# Altium footprint library Relays.PcbLib: 115 footprints (part 8 of 8)
Each footprint in its own frame and in the unit in brackets; x right, y up, seen from the top. Pads: shape width x height; smd on the part's side, far side on the other; paste and mask are expansions set on the pad; w line width, h text height; cw(c..) or ccw(c..) is an arc to the next point about the centre after c.
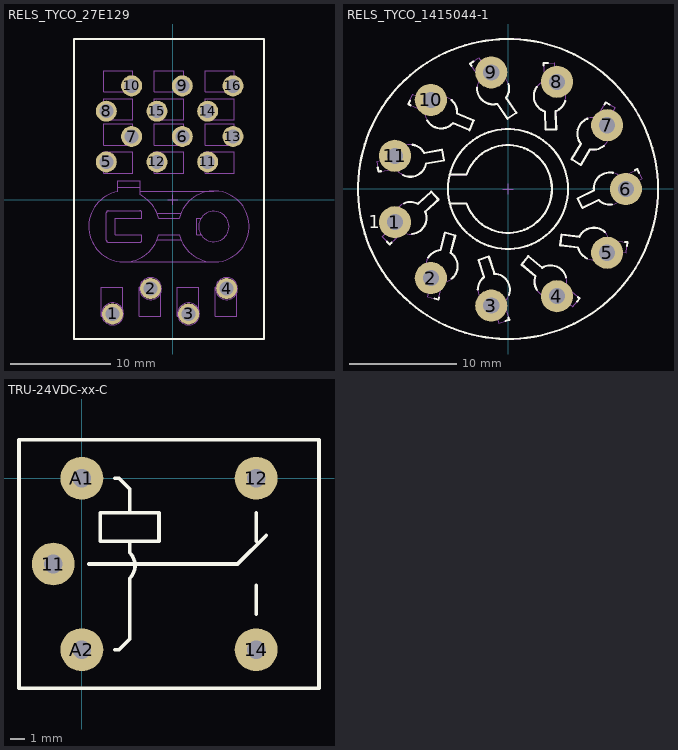
[diagram p7: the footprints below, top view; thin cyan lines are the x and y axes]

## RELS_TYCO_27E129 [mm] "16 Contacts PCB Socket For TYCO R10 Series Relays"
height 10.64
pads (16):
  round 2.1 hole 1.4: 1(-6.033,-11.43) 2(-2.222,-8.89) 3(1.587,-11.43) 4(5.398,-8.89) 5(-6.668,3.81) 6(0.953,6.35) 7(-4.128,6.35) 8(-6.668,8.89) 9(0.953,11.43) 10(-4.128,11.43) 11(3.493,3.81) 12(-1.587,3.81) 13(6.033,6.35) 14(3.493,8.89) 15(-1.587,8.89) 16(6.033,11.43)
Top Overlay:
  lines w0.2: -9.906,-13.945 -9.906,16.129 9.144,16.129 9.144,-13.945 -9.906,-13.945
Mechanical 8:
  circle w0.1: c5.398,-8.89 r1.1
  circle w0.1: c1.587,-11.43 r1.1
  circle w0.1: c-2.222,-8.89 r1.1
  circle w0.1: c-6.033,-11.43 r1.1
  lines w0.1: -7.168,3.81 -6.668,3.81 ; -7.168,8.89 -6.668,8.89 ; -6.668,3.31 -6.668,3.81 ; -6.668,4.31 -6.668,3.81 ; -6.668,8.39 -6.668,8.89 ; -6.668,9.39 -6.668,8.89 ; -6.533,-11.43 -6.033,-11.43 ; -6.168,3.81 -6.668,3.81 ; -6.168,8.89 -6.668,8.89 ; -6.033,-11.93 -6.033,-11.43 ; -6.033,-10.93 -6.033,-11.43 ; -5.533,-11.43 -6.033,-11.43 ; -4.628,6.35 -4.128,6.35 ; -4.628,11.43 -4.128,11.43 ; -4.128,5.85 -4.128,6.35 ; -4.128,6.85 -4.128,6.35 ; -4.128,10.93 -4.128,11.43 ; -4.128,11.93 -4.128,11.43 ; -3.628,6.35 -4.128,6.35 ; -3.628,11.43 -4.128,11.43 ; -2.723,-8.89 -2.222,-8.89 ; -2.222,-9.39 -2.222,-8.89 ; -2.222,-8.39 -2.222,-8.89 ; -2.088,3.81 -1.587,3.81 ; -2.088,8.89 -1.587,8.89 ; -1.723,-8.89 -2.222,-8.89 ; -1.587,3.31 -1.587,3.81 ; -1.587,4.31 -1.587,3.81 ; -1.587,8.39 -1.587,8.89 ; -1.587,9.39 -1.587,8.89 ; -1.088,3.81 -1.587,3.81 ; -1.088,8.89 -1.587,8.89 ; -0.5,0 0,0 ; 0,-0.5 0,0 ; 0,0.5 0,0 ; 0.453,6.35 0.953,6.35 ; 0.453,11.43 0.953,11.43 ; 0.5,0 0,0 ; 0.953,5.85 0.953,6.35 ; 0.953,6.85 0.953,6.35 ; 0.953,10.93 0.953,11.43 ; 0.953,11.93 0.953,11.43 ; 1.088,-11.43 1.587,-11.43 ; 1.453,6.35 0.953,6.35 ; 1.453,11.43 0.953,11.43 ; 1.587,-11.93 1.587,-11.43 ; 1.587,-10.93 1.587,-11.43 ; 2.088,-11.43 1.587,-11.43 ; 2.993,3.81 3.493,3.81 ; 2.993,8.89 3.493,8.89 ; 3.493,3.31 3.493,3.81 ; 3.493,4.31 3.493,3.81 ; 3.493,8.39 3.493,8.89 ; 3.493,9.39 3.493,8.89 ; 3.993,3.81 3.493,3.81 ; 3.993,8.89 3.493,8.89 ; 4.898,-8.89 5.398,-8.89 ; 5.398,-9.39 5.398,-8.89 ; 5.398,-8.39 5.398,-8.89 ; 5.533,6.35 6.033,6.35 ; 5.533,11.43 6.033,11.43 ; 5.898,-8.89 5.398,-8.89 ; 6.033,5.85 6.033,6.35 ; 6.033,6.85 6.033,6.35 ; 6.033,10.93 6.033,11.43 ; 6.033,11.93 6.033,11.43 ; 6.533,6.35 6.033,6.35 ; 6.533,11.43 6.033,11.43
Mechanical 14:
  circle w0.1: c4.115,-2.667 r1.524
  lines w0.1: -5.512,1.27 -3.277,1.27 ; -4.877,-6.223 4.115,-6.223 ; -3.277,0.889 4.115,0.889 ; -1.58,-4.001 0.818,-4.001 ; -1.58,-1.333 0.818,-1.333 ; 2.834,-3.493 2.4,-3.493 2.4,-1.841 2.834,-1.841 ; -9.906,-13.945 -9.906,16.129 9.144,16.129 9.144,-13.945 -9.906,-13.945 ; -7.163,-11.659 -7.163,-8.738 -5.029,-8.738 -5.029,-11.659 -7.163,-11.659 ; -6.922,2.692 -4.001,2.692 -4.001,4.826 -6.922,4.826 -6.922,2.692 ; -6.922,5.486 -4.001,5.486 -4.001,7.62 -6.922,7.62 -6.922,5.486 ; -6.922,8.026 -4.001,8.026 -4.001,10.16 -6.922,10.16 -6.922,8.026 ; -6.922,10.82 -4.001,10.82 -4.001,12.954 -6.922,12.954 -6.922,10.82 ; -6.655,-4.044 ccw(c-6.457,-4.044) -6.457,-4.242 -3.297,-4.242 ccw(c-3.297,-4.044) -3.099,-4.044 -3.099,-3.493 -5.791,-3.493 -5.791,-1.841 -3.099,-1.841 -3.099,-1.29 ccw(c-3.297,-1.29) -3.297,-1.092 -6.457,-1.092 ccw(c-6.457,-1.29) -6.655,-1.29 -6.655,-4.044 ; -5.512,0.832 ccw(c-4.877,-2.667) -1.418,-3.493 0.656,-3.493 ccw(c4.115,-2.667) 0.656,-1.842 -1.418,-1.841 ccw(c-4.877,-2.667) -3.277,0.509 -3.277,1.905 -5.512,1.905 -5.512,0.832 ; -3.353,-11.659 -3.353,-8.738 -1.219,-8.738 -1.219,-11.659 -3.353,-11.659 ; -1.841,2.692 1.079,2.692 1.079,4.826 -1.841,4.826 -1.841,2.692 ; -1.841,5.486 1.079,5.486 1.079,7.62 -1.841,7.62 -1.841,5.486 ; -1.841,8.026 1.079,8.026 1.079,10.16 -1.841,10.16 -1.841,8.026 ; -1.841,10.82 1.079,10.82 1.079,12.954 -1.841,12.954 -1.841,10.82 ; 0.457,-11.659 0.457,-8.738 2.591,-8.738 2.591,-11.659 0.457,-11.659 ; 3.239,2.692 3.239,4.826 6.16,4.826 6.16,2.692 3.239,2.692 ; 3.239,5.486 6.16,5.486 6.16,7.62 3.239,7.62 3.239,5.486 ; 3.239,8.026 6.16,8.026 6.16,10.16 3.239,10.16 3.239,8.026 ; 3.239,10.82 6.16,10.82 6.16,12.954 3.239,12.954 3.239,10.82 ; 4.267,-11.659 4.267,-8.738 6.401,-8.738 6.401,-11.659 4.267,-11.659
  text "13" at 3.608,5.85 h1
  text "10" at -6.531,10.93 h1
  text "9" at -1.218,10.93 h1
  text "16" at 3.604,10.93 h1
  text "14" at 4.519,8.39 h1
  text "15" at -0.532,8.39 h1
  text "8" at -5.341,8.39 h1
  text "7" at -6.281,5.85 h1
  text "6" at -1.196,5.85 h1
  text "11" at 4.669,3.31 h1
  text "12" at -0.541,3.31 h1
  text "5" at -5.362,3.31 h1
  text "4" at 4.934,-11.066 h1
  text "3" at 1.153,-10.127 h1
  text "2" at -2.653,-11.066 h1
  text "1" at -6.346,-10.127 h1
3D body "TYCO_27E129.stp": height 10.64, standoff -3.58, extent -9.906,-13.945 9.144,16.129

## RELS_TYCO_1415044-1 [mm] "Through Hole Round Socket for Relay 11 Pins, MT78603"
height 15.2
pads (11):
  round 3 hole 1.5: 1(-10.554,-3.099) 2(-7.203,-8.313) 3(-1.565,-10.888) 4(4.57,-10.006) 5(9.254,-5.947) 6(11,0) 7(9.254,5.947) 8(4.57,10.006) 9(-1.565,10.888) 10(-7.203,8.313) 11(-10.554,3.099)
Top Overlay:
  circle w0.2: c0,0 r14
  circle w0.2: c0,0 r5.6
  lines w0.2: -12.159,1.991 -12.095,1.623 -11.872,1.662 ; -11.304,-4.899 -11.054,-5.173 -10.888,-5.02 ; -9.799,1.301 ccw(c-9.125,2.642) -7.647,2.389 -5.985,2.675 -6.155,3.661 -7.816,3.374 ccw(c-9.125,2.642) -8.896,4.124 ; -9.715,-1.339 cw(c-9.105,-2.71) -8.4,-1.386 -7.157,-0.247 -6.482,-0.985 -7.725,-2.123 cw(c-9.105,-2.71) -8.946,-4.201 ; -9.152,8.249 -9.299,7.903 -9.089,7.814 ; -7.541,6.393 ccw(c-6.249,7.155) -5.142,6.143 -3.59,5.486 -3.2,6.407 -4.752,7.064 ccw(c-6.249,7.155) -5.254,8.277 ; -7.45,-6.379 cw(c-6.196,-7.202) -6.318,-5.707 -5.888,-4.077 -4.921,-4.332 -5.351,-5.962 cw(c-6.196,-7.202) -5.254,-8.369 ; -6.859,-10.233 -6.504,-10.327 -6.447,-10.11 ; -5.435,-1.35 -3.871,-1.35 ccw(c0,0) -3.871,1.35 -5.435,1.35 ; -3.422,11.486 -3.551,11.676 -3.239,11.889 ; -2.889,9.456 ccw(c-1.39,9.398) -1.005,7.948 -0.055,6.556 0.771,7.12 -0.18,8.512 ccw(c-1.39,9.398) 0.054,9.802 ; -2.82,-9.395 cw(c-1.32,-9.408) -2.231,-8.216 -2.75,-6.612 -1.798,-6.305 -1.28,-7.908 cw(c-1.32,-9.408) 0.104,-9.88 ; -0.237,-12.316 0.11,-12.203 0.042,-11.992 ; 2.682,9.518 ccw(c3.91,8.658) 3.45,7.23 3.498,5.545 4.497,5.573 4.45,7.258 ccw(c3.91,8.658) 5.344,8.216 ; 2.707,-9.43 cw(c3.975,-8.629) 2.564,-8.118 1.261,-7.05 1.895,-6.276 3.198,-7.345 cw(c3.975,-8.629) 5.428,-8.255 ; 3.33,11.511 3.323,11.743 3.704,11.753 ; 6.459,-10.488 6.689,-10.208 6.519,-10.068 ; 7.375,-6.471 cw(c8.008,-5.111) 6.546,-5.444 4.871,-5.25 4.987,-4.256 6.661,-4.451 cw(c8.008,-5.111) 9.027,-4.01 ; 7.402,6.559 ccw(c7.97,5.17) 6.811,4.218 5.94,2.775 6.796,2.258 7.667,3.701 ccw(c7.97,5.17) 8.936,4.023 ; 9.023,7.883 9.143,8.083 9.472,7.885 ; 9.691,-1.446 cw(c9.5,0.042) 8.451,-1.03 6.938,-1.774 6.497,-0.876 8.01,-0.133 cw(c9.5,0.042) 9.774,1.517 ; 10.928,-4.947 11.145,-4.972 11.104,-5.33 ; 11.851,1.754 12.062,1.858 12.232,1.512
  text "1" at -12.985,-3.645 h1.2
Mechanical 8:
  circle w0.05: c11,0 r0.75
  circle w0.05: c9.254,5.947 r0.75
  circle w0.05: c4.57,10.006 r0.75
  circle w0.05: c-1.565,10.888 r0.75
  circle w0.05: c-7.203,8.313 r0.75
  circle w0.05: c-10.554,3.099 r0.75
  circle w0.05: c-10.554,-3.099 r0.75
  circle w0.05: c-7.203,-8.313 r0.75
  circle w0.05: c-1.565,-10.888 r0.75
  circle w0.05: c4.57,-10.006 r0.75
  circle w0.05: c9.254,-5.947 r0.75
  lines w0.05: -11.054,-3.099 -10.554,-3.099 ; -11.054,3.099 -10.554,3.099 ; -10.554,-3.599 -10.554,-3.099 ; -10.554,-2.599 -10.554,-3.099 ; -10.554,2.599 -10.554,3.099 ; -10.554,3.599 -10.554,3.099 ; -10.054,-3.099 -10.554,-3.099 ; -10.054,3.099 -10.554,3.099 ; -7.703,-8.313 -7.203,-8.313 ; -7.703,8.313 -7.203,8.313 ; -7.203,-8.813 -7.203,-8.313 ; -7.203,-7.813 -7.203,-8.313 ; -7.203,7.813 -7.203,8.313 ; -7.203,8.813 -7.203,8.313 ; -6.703,-8.313 -7.203,-8.313 ; -6.703,8.313 -7.203,8.313 ; -2.065,-10.888 -1.565,-10.888 ; -2.065,10.888 -1.565,10.888 ; -1.565,-11.388 -1.565,-10.888 ; -1.565,-10.388 -1.565,-10.888 ; -1.565,10.388 -1.565,10.888 ; -1.565,11.388 -1.565,10.888 ; -1.065,-10.888 -1.565,-10.888 ; -1.065,10.888 -1.565,10.888 ; -0.5,0 0,0 ; 0,-0.5 0,0 ; 0,0.5 0,0 ; 0.5,0 0,0 ; 4.07,-10.006 4.57,-10.006 ; 4.07,10.006 4.57,10.006 ; 4.57,-10.506 4.57,-10.006 ; 4.57,-9.506 4.57,-10.006 ; 4.57,9.506 4.57,10.006 ; 4.57,10.506 4.57,10.006 ; 5.07,-10.006 4.57,-10.006 ; 5.07,10.006 4.57,10.006 ; 8.754,-5.947 9.254,-5.947 ; 8.754,5.947 9.254,5.947 ; 9.254,-6.447 9.254,-5.947 ; 9.254,-5.447 9.254,-5.947 ; 9.254,5.447 9.254,5.947 ; 9.254,6.447 9.254,5.947 ; 9.754,-5.947 9.254,-5.947 ; 9.754,5.947 9.254,5.947 ; 10.5,0 11,0 ; 11,-0.5 11,0 ; 11,0.5 11,0 ; 11.5,0 11,0
Mechanical 14:
  circle w0.1: c0,0 r14
  circle w0.1: c0,0 r5.6
  lines w0.1: -5.435,-1.35 -3.871,-1.35 ccw(c0,0) -3.871,1.35 -5.435,1.35 ; -12.265,2.609 -12.095,1.623 -10.434,1.909 ccw(c-9.125,2.642) -7.647,2.389 -5.985,2.675 -6.155,3.661 -7.816,3.374 ccw(c-9.125,2.642) -10.604,2.895 -12.265,2.609 ; -11.729,-4.435 -11.054,-5.173 -9.81,-4.034 ccw(c-9.105,-2.71) -7.725,-2.123 -6.482,-0.985 -7.157,-0.247 -8.4,-1.386 ccw(c-9.105,-2.71) -10.486,-3.296 -11.729,-4.435 ; -9.299,7.903 -7.747,7.246 ccw(c-6.249,7.155) -5.142,6.143 -3.59,5.486 -3.2,6.407 -4.752,7.064 ccw(c-6.249,7.155) -7.357,8.167 -8.909,8.824 -9.299,7.903 ; -7.471,-10.071 -6.504,-10.327 -6.073,-8.697 ccw(c-6.196,-7.202) -5.351,-5.962 -4.921,-4.332 -5.888,-4.077 -6.318,-5.707 ccw(c-6.196,-7.202) -7.04,-8.441 -7.471,-10.071 ; -3.551,11.676 -2.6,10.284 ccw(c-1.39,9.398) -1.005,7.948 -0.055,6.556 0.771,7.12 -0.18,8.512 ccw(c-1.39,9.398) -1.775,10.848 -2.725,12.24 -3.551,11.676 ; -2.75,-6.612 -2.231,-8.216 ccw(c-1.32,-9.408) -1.36,-10.907 -0.841,-12.511 0.11,-12.203 -0.409,-10.6 ccw(c-1.32,-9.408) -1.28,-7.908 -1.798,-6.305 -2.75,-6.612 ; 1.261,-7.05 2.564,-8.119 ccw(c3.975,-8.629) 4.751,-9.912 6.055,-10.981 6.689,-10.208 5.385,-9.139 ccw(c3.975,-8.629) 3.198,-7.345 1.895,-6.276 1.261,-7.05 ; 3.323,11.743 3.371,10.057 ccw(c3.91,8.658) 3.45,7.23 3.498,5.545 4.497,5.573 4.45,7.258 ccw(c3.91,8.658) 4.37,10.086 4.323,11.771 3.323,11.743 ; 4.871,-5.25 6.546,-5.444 ccw(c8.008,-5.111) 9.355,-5.771 11.03,-5.966 11.145,-4.972 9.471,-4.778 ccw(c8.008,-5.111) 6.661,-4.451 4.987,-4.256 4.871,-5.25 ; 5.94,2.775 6.811,4.218 cw(c7.97,5.17) 8.272,6.639 9.143,8.083 10,7.566 9.129,6.123 cw(c7.97,5.17) 7.667,3.701 6.796,2.258 5.94,2.775 ; 6.497,-0.876 8.01,-0.133 cw(c9.5,0.042) 10.549,1.114 12.062,1.858 12.503,0.96 10.99,0.217 cw(c9.5,0.042) 8.451,-1.03 6.938,-1.774 6.497,-0.876
  text "1" at -12.985,-3.645 h1.2
3D body "RELS_TYCO_1415044-1.stp": height 15.15, standoff -3.35, extent -13.999,-13.999 13.999,13.998

## TRU-24VDC-xx-C [mm] "Relay"
pads (5):
  round 3 hole 1.3: 11(-2,-6) 12(12.2,0) 14(12.2,-12) A1(0,0) A2(0,-12)
Top Overlay:
  lines w0.254: 0.5,-6 10.9,-6 12.9,-4 11.1,-5.8 ; 2.3,-12 2.6,-12 3.35,-11.25 3.35,-10.2 3.35,-7 ccw(c2.45,-6.1) 3.35,-5.2 3.35,-4.4 ; 2.3,0 2.6,0 3.35,-0.75 3.35,-2.4 ; 12.2,-9.5 12.2,-7.5 ; 12.2,-4.4 12.2,-2.4 ; -4.4,-14.7 16.6,-14.7 16.6,2.7 -4.4,2.7 -4.4,-14.7 ; 1.3,-4.4 5.4,-4.4 5.4,-2.4 1.3,-2.4 1.3,-4.4
3D body "User Library-TRU-XXVDC-SX-CX-R.step": height 20.51, standoff -4.49, extent -4.05,-14.4 16.25,2.4